# Altium footprint library MOLEX SMD.PcbLib: 54 footprints (part 4 of 4) (continued)
## MOLEX_502426-6030 [mm] "0.40mm Pitch SlimStack™ Dual Row 60 Circuits Surface Mount Vertical Receptacle Board-to-Board With Vacuum Tape" (continued)
Mechanical 15:
  lines w0.05: -7.8,-1.7 -7.8,1.7 7.8,1.7 7.8,-1.7 -7.8,-1.7
3D body "MOLEX_502426-6030.stp": height 0.98, standoff -0.02, extent -7.55,-1.3 7.55,1.3

## MOLEX_502430-6030 [mm] "0.40mm Pitch SlimStack™ Dual Row 60 Circuits Surface Mount Vertical Plug Board-to-Board With Vacuum Tape"
height 1
pads (62):
  rect 0.22x0.66 smd: 1(-5.8,0.855) 2(-5.8,-0.855) 3(-5.4,0.855) 4(-5.4,-0.855) 5(-5,0.855) 6(-5,-0.855) 7(-4.6,0.855) 8(-4.6,-0.855) 9(-4.2,0.855) 10(-4.2,-0.855) 11(-3.8,0.855) 12(-3.8,-0.855) 13(-3.4,0.855) 14(-3.4,-0.855) 15(-3,0.855) 16(-3,-0.855) 17(-2.6,0.855) 18(-2.6,-0.855) 19(-2.2,0.855) 20(-2.2,-0.855) 21(-1.8,0.855) 22(-1.8,-0.855) 23(-1.4,0.855) 24(-1.4,-0.855) 25(-1,0.855) 26(-1,-0.855) 27(-0.6,0.855) 28(-0.6,-0.855) 29(-0.2,0.855) 30(-0.2,-0.855) 31(0.2,0.855) 32(0.2,-0.855) 33(0.6,0.855) 34(0.6,-0.855) 35(1,0.855) 36(1,-0.855) 37(1.4,0.855) 38(1.4,-0.855) 39(1.8,0.855) 40(1.8,-0.855) 41(2.2,0.855) 42(2.2,-0.855) 43(2.6,0.855) 44(2.6,-0.855) 45(3,0.855) 46(3,-0.855) 47(3.4,0.855) 48(3.4,-0.855) 49(3.8,0.855) 50(3.8,-0.855) 51(4.2,0.855) 52(4.2,-0.855) 53(4.6,0.855) 54(4.6,-0.855) 55(5,0.855) 56(5,-0.855) 57(5.4,0.855) 58(5.4,-0.855) 59(5.8,0.855) 60(5.8,-0.855)
  rect 0.35x0.44 smd: 61(-6.75,0) 62(6.75,0)
Top Layer:
  region: -5.91,-0.533 -5.69,-0.533 -5.69,-0.255 -5.91,-0.255
  region: -5.51,-0.533 -5.29,-0.533 -5.29,-0.255 -5.51,-0.255
  region: -5.11,-0.533 -4.89,-0.533 -4.89,-0.255 -5.11,-0.255
  region: -4.71,-0.533 -4.49,-0.533 -4.49,-0.255 -4.71,-0.255
  region: -4.31,-0.533 -4.09,-0.533 -4.09,-0.255 -4.31,-0.255
  region: -3.91,-0.533 -3.69,-0.533 -3.69,-0.255 -3.91,-0.255
  region: -3.51,-0.533 -3.29,-0.533 -3.29,-0.255 -3.51,-0.255
  region: -3.11,-0.533 -2.89,-0.533 -2.89,-0.255 -3.11,-0.255
  region: -2.71,-0.533 -2.49,-0.533 -2.49,-0.255 -2.71,-0.255
  region: -2.31,-0.533 -2.09,-0.533 -2.09,-0.255 -2.31,-0.255
  region: -1.91,-0.533 -1.69,-0.533 -1.69,-0.255 -1.91,-0.255
  region: -1.51,-0.533 -1.29,-0.533 -1.29,-0.255 -1.51,-0.255
  region: -1.11,-0.533 -0.89,-0.533 -0.89,-0.255 -1.11,-0.255
  region: -0.71,-0.533 -0.49,-0.533 -0.49,-0.255 -0.71,-0.255
  region: -0.31,-0.533 -0.09,-0.533 -0.09,-0.255 -0.31,-0.255
  region: 0.09,-0.533 0.31,-0.533 0.31,-0.255 0.09,-0.255
  region: 0.49,-0.533 0.71,-0.533 0.71,-0.255 0.49,-0.255
  region: 0.89,-0.533 1.11,-0.533 1.11,-0.255 0.89,-0.255
  region: 1.29,-0.533 1.51,-0.533 1.51,-0.255 1.29,-0.255
  region: 1.69,-0.533 1.91,-0.533 1.91,-0.255 1.69,-0.255
  region: 2.09,-0.533 2.31,-0.533 2.31,-0.255 2.09,-0.255
  region: 2.49,-0.533 2.71,-0.533 2.71,-0.255 2.49,-0.255
  region: 2.89,-0.533 3.11,-0.533 3.11,-0.255 2.89,-0.255
  region: 3.29,-0.533 3.51,-0.533 3.51,-0.255 3.29,-0.255
  region: 3.69,-0.533 3.91,-0.533 3.91,-0.255 3.69,-0.255
  region: 4.09,-0.533 4.31,-0.533 4.31,-0.255 4.09,-0.255
  region: 4.49,-0.533 4.71,-0.533 4.71,-0.255 4.49,-0.255
  region: 4.89,-0.533 5.11,-0.533 5.11,-0.255 4.89,-0.255
  region: 5.29,-0.533 5.51,-0.533 5.51,-0.255 5.29,-0.255
  region: 5.69,-0.533 5.91,-0.533 5.91,-0.255 5.69,-0.255
  region: 5.69,0.533 5.91,0.533 5.91,0.255 5.69,0.255
  region: 5.29,0.533 5.51,0.533 5.51,0.255 5.29,0.255
  region: 4.89,0.533 5.11,0.533 5.11,0.255 4.89,0.255
  region: 4.49,0.533 4.71,0.533 4.71,0.255 4.49,0.255
  region: 4.09,0.533 4.31,0.533 4.31,0.255 4.09,0.255
  region: 3.69,0.533 3.91,0.533 3.91,0.255 3.69,0.255
  region: 3.29,0.533 3.51,0.533 3.51,0.255 3.29,0.255
  region: 2.89,0.533 3.11,0.533 3.11,0.255 2.89,0.255
  region: 2.49,0.533 2.71,0.533 2.71,0.255 2.49,0.255
  region: 2.09,0.533 2.31,0.533 2.31,0.255 2.09,0.255
  region: 1.69,0.533 1.91,0.533 1.91,0.255 1.69,0.255
  region: 1.29,0.533 1.51,0.533 1.51,0.255 1.29,0.255
  region: 0.89,0.533 1.11,0.533 1.11,0.255 0.89,0.255
  region: 0.49,0.533 0.71,0.533 0.71,0.255 0.49,0.255
  region: 0.09,0.533 0.31,0.533 0.31,0.255 0.09,0.255
  region: -0.31,0.533 -0.09,0.533 -0.09,0.255 -0.31,0.255
  region: -0.71,0.533 -0.49,0.533 -0.49,0.255 -0.71,0.255
  region: -1.11,0.533 -0.89,0.533 -0.89,0.255 -1.11,0.255
  region: -1.51,0.533 -1.29,0.533 -1.29,0.255 -1.51,0.255
  region: -1.91,0.533 -1.69,0.533 -1.69,0.255 -1.91,0.255
  region: -2.31,0.533 -2.09,0.533 -2.09,0.255 -2.31,0.255
  region: -2.71,0.533 -2.49,0.533 -2.49,0.255 -2.71,0.255
  region: -3.11,0.533 -2.89,0.533 -2.89,0.255 -3.11,0.255
  region: -3.51,0.533 -3.29,0.533 -3.29,0.255 -3.51,0.255
  region: -3.91,0.533 -3.69,0.533 -3.69,0.255 -3.91,0.255
  region: -4.31,0.533 -4.09,0.533 -4.09,0.255 -4.31,0.255
  region: -4.71,0.533 -4.49,0.533 -4.49,0.255 -4.71,0.255
  region: -5.11,0.533 -4.89,0.533 -4.89,0.255 -5.11,0.255
  region: -5.51,0.533 -5.29,0.533 -5.29,0.255 -5.51,0.255
  region: -5.91,0.533 -5.69,0.533 -5.69,0.255 -5.91,0.255
Top Overlay:
  circle w0.25: c-6.525,1.6 r0.125
  lines w0.2: -7.13,-0.57 -7.13,-0.77 -6.84,-0.77 ; -7.13,0.57 -7.13,0.77 ; -6.84,-0.735 -6.675,-0.735 -6.675,-0.57 ; -6.675,-0.72 -6.47,-0.72 -6.42,-0.77 -6.26,-0.77 ; -6.675,0.57 -6.675,0.735 ; -6.675,0.72 -6.47,0.72 -6.42,0.77 -6.26,0.77 ; 6.26,-0.77 6.42,-0.77 6.47,-0.72 6.675,-0.72 ; 6.26,0.77 6.42,0.77 6.47,0.72 6.675,0.72 ; 6.675,-0.57 6.675,-0.735 6.84,-0.735 ; 6.675,0.57 6.675,0.735 ; 6.84,-0.77 7.13,-0.77 7.13,-0.57 ; 7.13,0.57 7.13,0.77 ; -7.13,0.77 -6.84,0.77 -7.13,0.77 ; -6.675,0.735 -6.84,0.735 -6.675,0.735 ; 6.675,0.735 6.84,0.735 6.675,0.735 ; 7.13,0.77 6.84,0.77 7.13,0.77
Mechanical 8:
  lines w0.05: -0.5,0 0,0 ; 0,-0.5 0,0 ; 0,0.5 0,0 ; 0.5,0 0,0 ; -6.925,-0.22 -6.75,0 -6.925,0.22 ; -6.925,-0.22 -6.575,-0.22 -6.575,0.22 -6.925,0.22 ; -6.925,-0.22 -6.925,0.22 ; -5.95,-0.525 -5.8,-0.39 -5.65,-0.525 ; -5.95,-0.525 -5.91,-0.525 -5.91,-1.185 ; -5.95,-0.525 -5.95,-0.255 -5.65,-0.255 -5.65,-0.525 ; -5.95,0.525 -5.8,0.39 -5.65,0.525 ; -5.95,0.525 -5.91,0.525 -5.91,1.185 ; -5.95,0.525 -5.95,0.255 -5.65,0.255 -5.65,0.525 ; -5.91,-1.185 -5.8,-0.855 -5.69,-1.185 ; -5.91,-1.185 -5.69,-1.185 ; -5.91,1.185 -5.8,0.855 -5.69,1.185 ; -5.91,1.185 -5.69,1.185 ; -5.69,-1.185 -5.69,-0.525 -5.65,-0.525 ; -5.69,1.185 -5.69,0.525 -5.65,0.525 ; 5.65,-0.525 5.8,-0.39 5.95,-0.525 ; 5.65,-0.525 5.69,-0.525 5.69,-1.185 ; 5.65,-0.525 5.65,-0.255 5.95,-0.255 5.95,-0.525 ; 5.65,0.525 5.8,0.39 5.95,0.525 ; 5.65,0.525 5.69,0.525 5.69,1.185 ; 5.65,0.525 5.65,0.255 5.95,0.255 5.95,0.525 ; 5.69,-1.185 5.8,-0.855 5.91,-1.185 ; 5.69,-1.185 5.91,-1.185 ; 5.69,1.185 5.8,0.855 5.91,1.185 ; 5.69,1.185 5.91,1.185 ; 5.91,-1.185 5.91,-0.525 5.95,-0.525 ; 5.91,1.185 5.91,0.525 5.95,0.525 ; 6.925,-0.22 6.75,0 6.925,0.22 ; 6.925,-0.22 6.925,0.22 ; 6.925,-0.22 6.575,-0.22 6.575,0.22 6.925,0.22
Mechanical 14:
  circle w0.25: c-6.525,1.6 r0.125
  lines w0.1: -6.84,-0.735 -6.675,-0.735 -6.675,0.735 -6.84,0.735 ; -6.675,-0.72 -6.47,-0.72 -6.42,-0.77 -6.15,-0.77 -6.1,-0.72 -5.87,-0.72 ; -6.675,0.72 -6.47,0.72 -6.42,0.77 -6.15,0.77 -6.1,0.72 -5.87,0.72 ; -5.87,-0.31 -5.87,-1.04 -5.73,-1.04 -5.73,-0.31 ; -5.87,0.31 -5.87,1.04 -5.73,1.04 -5.73,0.31 ; 5.73,-0.31 5.73,-1.04 5.87,-1.04 5.87,-0.31 ; 5.73,0.31 5.73,1.04 5.87,1.04 5.87,0.31 ; 5.87,-0.72 6.1,-0.72 6.15,-0.77 6.42,-0.77 6.47,-0.72 6.675,-0.72 ; 5.87,0.72 6.1,0.72 6.15,0.77 6.42,0.77 6.47,0.72 6.675,0.72 ; 6.84,-0.735 6.675,-0.735 6.675,0.735 6.84,0.735 ; -7.13,-0.77 -6.84,-0.77 -6.84,0.77 -7.13,0.77 -7.13,-0.77 ; -6.3,-0.31 -6.3,0.31 6.3,0.31 6.3,-0.31 -6.3,-0.31 ; 6.84,-0.77 7.13,-0.77 7.13,0.77 6.84,0.77 6.84,-0.77
Mechanical 15:
  lines w0.05: -7.38,-1.435 7.38,-1.435 7.38,1.435 -7.38,1.435 -7.38,-1.435
3D body "MOLEX_502430-6030.stp": height 0.78, standoff -0.02, extent -7.13,-1.04 7.13,1.04

## MOLEX_502570-0893 [mm] "1.10mm Pitch, Surface Mount, Normal Mount MicroSD Memory Card Connector"
height 2.03
pads (14):
  rect 0.8x1.5 smd: 1(-3.85,0) 2(-2.75,0) 3(-1.65,0) 4(-0.55,0) 5(0.55,0) 6(1.65,0) 7(2.75,0) 8(3.85,0)
  rect 1.4x1.7 smd: 9(-7.6,2.9) 10(5.3,2.9)
  rect 1.5x1.15 smd: 11(-4.05,-11.575) 12(-1.75,-11.575) 13(4.85,-11.575)
  rect 1.15x1.5 smd: 14(5.425,-6.85)
Top Layer keep-out:
  lines w0.1: -0.8,-11.687 0.2,-11.687 0.2,-11.2 -0.8,-11.2 -0.8,-11.687 ; 2.85,-10.8 5.75,-10.8 5.75,-9.4 2.85,-9.4 2.85,-10.8 ; 5.05,-5.9 5.05,-4.9 5.55,-4.9 5.55,-5.9 5.05,-5.9
Top Overlay:
  circle w0.25: c-3.975,2.925 r0.125
  lines w0.2: -8.05,1.65 -8.05,-11.9 -5.2,-11.9 ; -7.2,1.65 -7.2,-1.2 ccw(c-7.1,-1.2) -7.1,-1.3 -7,-1.3 ccw(c-7,-1.2) -6.9,-1.2 -6.9,1.65 ; -6.9,2.97 -6.9,3.6 ; -6.5,1.7 -6.45,1.7 cw(c-6.45,1.65) -6.4,1.65 -6.4,-1.2 ccw(c-6.3,-1.2) -6.3,-1.3 -6.2,-1.3 ccw(c-6.2,-1.2) -6.1,-1.2 -6.1,1.85 ccw(c-6.25,1.85) -6.25,2 -6.5,2 ; -6.5,3.6 -4.69,3.6 -4.69,2.323 ; -6.24,3.25 -6.29,3.25 -6.29,3.6 -6.24,3.55 -6.24,2.658 ccw(c-6.14,2.658) -6.158,2.56 ccw(c-0.65,32.05) 4.2,2.445 ; -6.21,3.22 -5.36,3.22 ; -6.21,3.6 -6.21,3.07 -5.71,3.07 -5.61,2.97 -5.36,2.97 -5.36,3.6 ; -6.01,3.07 cw(c-6.01,2.87) -5.81,2.87 -5.81,2.497 ; -5.81,2.702 -5.661,2.577 cw(c-5.79,2.424) -5.593,2.46 ; -5.79,-10.4 -4.99,-10.4 ; -4.99,-10.5 -4.99,-9.169 -6.034,-9.169 -5.79,-10.291 -5.79,-10.5 cw(c-5.94,-10.5) -5.94,-10.65 -6.57,-10.65 cw(c-6.57,-10.5) -6.72,-10.5 -6.72,-6.25 cw(c-6.57,-6.25) -6.57,-6.1 -6.035,-6.1 ccw(c-6.035,-5.95) -5.885,-5.95 -5.885,-5.55 cw(c-5.735,-5.55) -5.735,-5.4 -5.09,-5.4 cw(c-5.09,-5.9) -4.59,-5.9 -4.59,-10.5 ; -4.69,2.35 -4.39,2.35 -4.39,2.284 ; -4.2,-1.15 -4.2,-2 ccw(c-3.2,-2) -3.2,-3 -1.25,-3 ccw(c-1.25,-2) -0.25,-2 -0.25,-1.15 ; 0.25,-1.15 0.25,-2 ccw(c1.25,-2) 1.25,-3 3.2,-3 ccw(c3.2,-2) 4.2,-2 4.2,-1.15 ; 0.6,-11.9 3.7,-11.9 ; 4.473,-8 ccw(c4.56,-8.05) 4.46,-8.05 4.46,-8.55 ccw(c4.56,-8.55) 4.56,-8.65 5.75,-8.65 ; 5.06,-8.648 5.06,-8 ; 5.18,-4.5 5.18,-2.85 cw(c5.28,-2.85) 5.28,-2.75 5.75,-2.75 ; 5.18,-3.53 5.6,-3.53 ; 5.18,-3.35 5.6,-3.35 ; 5.18,-3.2 5.6,-3.2 ; 5.18,-3.18 5.5,-3.18 ccw(c5.5,-2.93) 5.75,-2.93 ; 5.18,-3.03 5.5,-3.03 ccw(c5.5,-2.93) 5.6,-2.93 ; 5.18,-3.01 5.41,-3.01 5.6,-2.82 ; 5.18,-2.91 5.51,-2.91 ; 5.37,-4.5 5.37,-3.53 ; 5.37,-4.35 5.6,-4.35 ; 5.37,-3.75 5.6,-3.75 ; 5.41,-8.65 5.41,-8 ; 5.47,-4.5 5.47,-4.35 ; 5.47,-3.75 5.47,-3.53 ; 5.6,-8.641 5.6,-8 ; 5.6,-4.5 5.6,-2.75 ; 5.6,-3.4 5.75,-3.399 ; 5.75,-9 5.75,-8 ; 5.75,-4.5 5.75,1.65 ; -7.5,-5.55 ccw(c-7.35,-5.55) -7.35,-5.7 -6.55,-5.7 ccw(c-6.55,-5.55) -6.4,-5.55 -6.4,-3.4 ccw(c-6.5,-3.4) -6.5,-3.3 -6.6,-3.3 ccw(c-6.6,-3.4) -6.7,-3.4 -6.7,-5.25 cw(c-6.75,-5.25) -6.75,-5.3 -7.15,-5.3 cw(c-7.15,-5.25) -7.2,-5.25 -7.2,-3.4 ccw(c-7.3,-3.4) -7.3,-3.3 -7.4,-3.3 ccw(c-7.4,-3.4) -7.5,-3.4 -7.5,-5.55
Mechanical 8:
  lines w0.1: -8.1,2.9 -7.6,2.9 ; -7.6,2.4 -7.6,2.9 ; -7.6,3.4 -7.6,2.9 ; -7.1,2.9 -7.6,2.9 ; -4.55,-11.575 -4.05,-11.575 ; -4.35,0 -3.85,0 ; -4.05,-12.075 -4.05,-11.575 ; -4.05,-11.075 -4.05,-11.575 ; -3.85,-0.5 -3.85,0 ; -3.85,0.5 -3.85,0 ; -3.55,-11.575 -4.05,-11.575 ; -3.35,0 -3.85,0 ; -3.25,0 -2.75,0 ; -2.75,-0.5 -2.75,0 ; -2.75,0.5 -2.75,0 ; -2.25,-11.575 -1.75,-11.575 ; -2.25,0 -2.75,0 ; -2.15,0 -1.65,0 ; -1.75,-12.075 -1.75,-11.575 ; -1.75,-11.075 -1.75,-11.575 ; -1.65,-0.5 -1.65,0 ; -1.65,0.5 -1.65,0 ; -1.25,-11.575 -1.75,-11.575 ; -1.15,0 -1.65,0 ; -1.05,0 -0.55,0 ; -0.55,-0.5 -0.55,0 ; -0.55,0.5 -0.55,0 ; -0.354,-0.354 0,0 ; -0.354,0.354 0,0 ; -0.05,0 -0.55,0 ; 0.05,0 0.55,0 ; 0.354,-0.354 0,0 ; 0.354,0.354 0,0 ; 0.55,-0.5 0.55,0 ; 0.55,0.5 0.55,0 ; 1.05,0 0.55,0 ; 1.15,0 1.65,0 ; 1.65,-0.5 1.65,0 ; 1.65,0.5 1.65,0 ; 2.15,0 1.65,0 ; 2.25,0 2.75,0 ; 2.75,-0.5 2.75,0 ; 2.75,0.5 2.75,0 ; 3.25,0 2.75,0 ; 3.35,0 3.85,0 ; 3.85,-0.5 3.85,0 ; 3.85,0.5 3.85,0 ; 4.35,-11.575 4.85,-11.575 ; 4.35,0 3.85,0 ; 4.8,2.9 5.3,2.9 ; 4.85,-12.075 4.85,-11.575 ; 4.85,-11.075 4.85,-11.575 ; 4.925,-6.85 5.425,-6.85 ; 5.3,2.4 5.3,2.9 ; 5.3,3.4 5.3,2.9 ; 5.35,-11.575 4.85,-11.575 ; 5.425,-7.35 5.425,-6.85 ; 5.425,-6.35 5.425,-6.85 ; 5.8,2.9 5.3,2.9 ; 5.925,-6.85 5.425,-6.85 ; -0.8,-11.7 -0.8,-11.2 ; -0.8,-11.7 0.2,-11.7 ; -0.8,-11.7 -0.3,-11.45 ; -0.8,-11.2 0.2,-11.2 ; -0.8,-11.2 -0.3,-11.45 ; -0.3,-11.45 0.2,-11.2 ; -0.3,-11.45 0.2,-11.7 ; 0.2,-11.7 0.2,-11.2 ; 2.85,-10.8 5.75,-10.8 ; 2.85,-10.8 2.85,-9.4 ; 2.85,-10.8 4.3,-10.1 ; 2.85,-9.4 5.75,-9.4 ; 2.85,-9.4 4.3,-10.1 ; 4.3,-10.1 5.75,-9.4 ; 4.3,-10.1 5.75,-10.8 ; 5.05,-5.9 5.05,-4.9 ; 5.05,-5.9 5.55,-5.9 ; 5.05,-5.9 5.3,-5.4 ; 5.05,-4.9 5.55,-4.9 ; 5.05,-4.9 5.3,-5.4 ; 5.3,-5.4 5.55,-4.9 ; 5.3,-5.4 5.55,-5.9 ; 5.55,-5.9 5.55,-4.9 ; 5.75,-10.8 5.75,-9.4 ; -8.3,2.05 -6.9,2.05 -6.9,3.75 -8.3,3.75 -8.3,2.05 ; -4.8,-12.15 -3.3,-12.15 -3.3,-11 -4.8,-11 -4.8,-12.15 ; -4.25,-0.75 -3.45,-0.75 -3.45,0.75 -4.25,0.75 -4.25,-0.75 ; -3.15,-0.75 -2.35,-0.75 -2.35,0.75 -3.15,0.75 -3.15,-0.75 ; -2.5,-12.15 -2.5,-11 -1,-11 -1,-12.15 -2.5,-12.15 ; -2.05,-0.75 -1.25,-0.75 -1.25,0.75 -2.05,0.75 -2.05,-0.75 ; -0.95,-0.75 -0.15,-0.75 -0.15,0.75 -0.95,0.75 -0.95,-0.75 ; 0.15,-0.75 0.95,-0.75 0.95,0.75 0.15,0.75 0.15,-0.75 ; 1.25,-0.75 2.05,-0.75 2.05,0.75 1.25,0.75 1.25,-0.75 ; 2.35,-0.75 3.15,-0.75 3.15,0.75 2.35,0.75 2.35,-0.75 ; 3.45,-0.75 4.25,-0.75 4.25,0.75 3.45,0.75 3.45,-0.75 ; 4.1,-12.15 4.1,-11 5.6,-11 5.6,-12.15 4.1,-12.15 ; 4.6,2.05 6,2.05 6,3.75 4.6,3.75 4.6,2.05 ; 4.85,-7.6 6,-7.6 6,-6.1 4.85,-6.1 4.85,-7.6
Mechanical 14:
  drawing of 210 lines, arcs and shapes, not listed
Mechanical 15:
  lines w0.05: -8.55,-12.4 6.25,-12.4 6.25,4 -8.55,4 -8.55,-12.4
3D body "MOLEX_502570-0893.stp": height 1.8, standoff 0, extent -8.05,-11.9 5.75,3.6

## MOLEX_504618-2010 [mm] "0.35mm Pitch SlimStack™ Dual Row 20 Circuits Surface Mount Vertical Receptacle (0.60mm Mated Heights)"
height 0.6
pads (24):
  rect 0.18x0.4 smd: 1(-1.575,-0.95) 2(-1.575,0.95) 3(-1.225,-0.95) 4(-1.225,0.95) 5(-0.875,-0.95) 6(-0.875,0.95) 7(-0.525,-0.95) 8(-0.525,0.95) 9(-0.175,-0.95) 10(-0.175,0.95) 11(0.175,-0.95) 12(0.175,0.95) 13(0.525,-0.95) 14(0.525,0.95) 15(0.875,-0.95) 16(0.875,0.95) 17(1.225,-0.95) 18(1.225,0.95) 19(1.575,-0.95) 20(1.575,0.95)
  rect 0.46x0.33 smd: 21(-2.23,-0.945) 22(-2.23,0.945) 23(2.23,-0.945) 24(2.23,0.945)
Top Layer keep-out:
  rectangle: -1.75,-0.58 1.75,-0.15
  rectangle: -1.75,0.15 1.75,0.58
Top Overlay:
  circle w0.25: c-1.575,-1.675 r0.125
  lines w0.2: -2.795,-0.43 -2.795,0.43 ; -2.705,-0.43 -2.705,0.43 ; -2.385,-0.43 -2.385,0.43 ; 2.385,-0.43 2.385,0.43 ; 2.705,-0.43 2.705,0.43 ; 2.795,-0.43 2.795,0.43 ; -2.055,-0.37 -2.055,0.37 2.055,0.37 2.055,-0.37 -2.055,-0.37
Mechanical 8:
  drawing of 162 lines, arcs and shapes, not listed
Mechanical 14:
  circle w0.25: c-1.575,-1.675 r0.125
  lines w0.1: -2.095,-0.88 -2.095,-0.61 -2.385,-0.61 -2.385,0.61 -2.095,0.61 -2.095,0.88 ; -2.095,-0.735 -2.035,-0.735 ; -2.095,0.735 -2.035,0.735 ; -1.855,-0.88 -1.815,-0.88 ; -1.855,-0.735 -1.815,-0.735 ; -1.855,0.735 -1.815,0.735 ; -1.855,0.88 -1.815,0.88 ; 1.815,-0.88 1.855,-0.88 ; 1.815,-0.735 1.855,-0.735 ; 1.815,0.735 1.855,0.735 ; 1.815,0.88 1.855,0.88 ; 2.035,-0.735 2.095,-0.735 ; 2.035,0.735 2.095,0.735 ; 2.095,-0.88 2.095,-0.61 2.385,-0.61 2.385,0.61 2.095,0.61 2.095,0.88 ; -2.795,-0.97 -1.855,-0.97 -1.855,-0.64 -2.035,-0.64 -2.035,-0.88 -2.705,-0.88 -2.705,0.88 -2.035,0.88 -2.035,0.64 -1.855,0.64 -1.855,0.97 -2.795,0.97 -2.795,-0.97 ; -2.055,-0.37 -2.055,0.37 2.055,0.37 2.055,-0.37 -2.055,-0.37 ; -1.815,-1 -1.815,-0.64 1.815,-0.64 1.815,-1 -1.815,-1 ; -1.815,0.64 -1.815,1 1.815,1 1.815,0.64 -1.815,0.64 ; 1.855,-0.97 2.795,-0.97 2.795,0.97 1.855,0.97 1.855,0.64 2.035,0.64 2.035,0.88 2.705,0.88 2.705,-0.88 2.035,-0.88 2.035,-0.64 1.855,-0.64 1.855,-0.97
Mechanical 15:
  lines w0.05: -3.145,-1.4 -3.145,1.4 3.145,1.4 3.145,-1.4 -3.145,-1.4
3D body "MOLEX_504618-2010.stp": height 0.6, standoff 0, extent -2.825,-1 2.825,1

## MOLEX_504618-5010 [mm] "0.35mm Pitch SlimStack™ Dual Row 50 Circuits Surface Mount Vertical Receptacle (0.60mm Mated Heights)"
height 0.6
pads (54):
  rect 0.18x0.4 smd: 1(-4.2,-0.95) 2(-4.2,0.95) 3(-3.85,-0.95) 4(-3.85,0.95) 5(-3.5,-0.95) 6(-3.5,0.95) 7(-3.15,-0.95) 8(-3.15,0.95) 9(-2.8,-0.95) 10(-2.8,0.95) 11(-2.45,-0.95) 12(-2.45,0.95) 13(-2.1,-0.95) 14(-2.1,0.95) 15(-1.75,-0.95) 16(-1.75,0.95) 17(-1.4,-0.95) 18(-1.4,0.95) 19(-1.05,-0.95) 20(-1.05,0.95) 21(-0.7,-0.95) 22(-0.7,0.95) 23(-0.35,-0.95) 24(-0.35,0.95) 25(0,-0.95) 26(0,0.95) 27(0.35,-0.95) 28(0.35,0.95) 29(0.7,-0.95) 30(0.7,0.95) 31(1.05,-0.95) 32(1.05,0.95) 33(1.4,-0.95) 34(1.4,0.95) 35(1.75,-0.95) 36(1.75,0.95) 37(2.1,-0.95) 38(2.1,0.95) 39(2.45,-0.95) 40(2.45,0.95) 41(2.8,-0.95) 42(2.8,0.95) 43(3.15,-0.95) 44(3.15,0.95) 45(3.5,-0.95) 46(3.5,0.95) 47(3.85,-0.95) 48(3.85,0.95) 49(4.2,-0.95) 50(4.2,0.95)
  rect 0.46x0.33 smd: 51(-4.855,-0.945) 52(-4.855,0.945) 53(4.855,-0.945) 54(4.855,0.945)
Top Layer keep-out:
  rectangle: -4.375,0.15 4.375,0.58
  rectangle: -4.375,-0.58 4.375,-0.15
Top Overlay:
  circle w0.25: c-4.2,-1.675 r0.125
  lines w0.2: -5.42,-0.43 -5.42,0.43 ; -5.33,-0.43 -5.33,0.43 ; -5.01,-0.43 -5.01,0.43 ; 5.01,-0.43 5.01,0.43 ; 5.33,-0.43 5.33,0.43 ; 5.42,-0.43 5.42,0.43 ; -4.68,-0.37 -4.68,0.37 4.68,0.37 4.68,-0.37 -4.68,-0.37
Mechanical 8:
  drawing of 342 lines, arcs and shapes, not listed
Mechanical 14:
  circle w0.25: c-4.2,-1.675 r0.125
  lines w0.1: -4.72,-0.88 -4.72,-0.61 -5.01,-0.61 -5.01,0.61 -4.72,0.61 -4.72,0.88 ; -4.72,-0.735 -4.66,-0.735 ; -4.72,0.735 -4.66,0.735 ; -4.48,-0.88 -4.44,-0.88 ; -4.48,-0.735 -4.44,-0.735 ; -4.48,0.735 -4.44,0.735 ; -4.48,0.88 -4.44,0.88 ; 4.44,-0.88 4.48,-0.88 ; 4.44,-0.735 4.48,-0.735 ; 4.44,0.735 4.48,0.735 ; 4.44,0.88 4.48,0.88 ; 4.66,-0.735 4.72,-0.735 ; 4.66,0.735 4.72,0.735 ; 4.72,-0.88 4.72,-0.61 5.01,-0.61 5.01,0.61 4.72,0.61 4.72,0.88 ; -5.42,-0.97 -4.48,-0.97 -4.48,-0.64 -4.66,-0.64 -4.66,-0.88 -5.33,-0.88 -5.33,0.88 -4.66,0.88 -4.66,0.64 -4.48,0.64 -4.48,0.97 -5.42,0.97 -5.42,-0.97 ; -4.68,-0.37 -4.68,0.37 4.68,0.37 4.68,-0.37 -4.68,-0.37 ; -4.44,-1 -4.44,-0.64 4.44,-0.64 4.44,-1 -4.44,-1 ; -4.44,0.64 -4.44,1 4.44,1 4.44,0.64 -4.44,0.64 ; 4.48,-0.97 5.42,-0.97 5.42,0.97 4.48,0.97 4.48,0.64 4.66,0.64 4.66,0.88 5.33,0.88 5.33,-0.88 4.66,-0.88 4.66,-0.64 4.48,-0.64 4.48,-0.97
Mechanical 15:
  lines w0.05: -5.67,-1.4 -5.67,1.4 5.67,1.4 5.67,-1.4 -5.67,-1.4
3D body "MOLEX_504618-5010.stp": height 0.6, standoff 0, extent -5.45,-1 5.45,1

## MOLEX_504622-2010 [mm] "0.35mm Pitch SlimStack™ Dual Row 20 Circuits Surface Mount Vertical Plug (0.60mm Mated Heights)"
height 0.48
pads (24):
  rect 0.18x0.485 smd: 1(1.575,-0.907) 2(1.575,0.907) 3(1.225,-0.907) 4(1.225,0.907) 5(0.875,-0.907) 6(0.875,0.907) 7(0.525,-0.907) 8(0.525,0.907) 9(0.175,-0.907) 10(0.175,0.907) 11(-0.175,-0.907) 12(-0.175,0.907) 13(-0.525,-0.907) 14(-0.525,0.907) 15(-0.875,-0.907) 16(-0.875,0.907) 17(-1.225,-0.907) 18(-1.225,0.907) 19(-1.575,-0.907) 20(-1.575,0.907)
  rect 0.28x0.485 smd: 21(1.975,-0.907) 22(1.975,0.907) 23(-1.975,-0.907) 24(-1.975,0.907)
Top Layer keep-out:
  rectangle: -2.15,0.335 2.15,0.565
  region: 2.15,-0.335 -2.15,-0.335 -2.15,-0.565 2.15,-0.565
Top Overlay:
  circle w0.25: c1.575,-1.675 r0.125
Mechanical 8:
  drawing of 292 lines, arcs and shapes, not listed
Mechanical 14:
  circle w0.25: c1.575,-1.675 r0.125
  lines w0.1: -2.395,-0.172 -2.055,-0.172 ; -2.395,0.172 -2.055,0.172 ; -1.975,-0.8 -1.875,-0.8 ; -1.975,-0.63 -1.975,-1 -1.875,-1 -1.875,-0.63 ; -1.975,0.63 -1.975,1 -1.875,1 -1.875,0.63 ; -1.975,0.8 -1.875,0.8 ; -1.625,-0.8 -1.525,-0.8 ; -1.625,-0.63 -1.625,-1 -1.525,-1 -1.525,-0.63 ; -1.625,0.63 -1.625,1 -1.525,1 -1.525,0.63 ; -1.625,0.8 -1.525,0.8 ; -1.275,-0.8 -1.175,-0.8 ; -1.275,-0.63 -1.275,-1 -1.175,-1 -1.175,-0.63 ; -1.275,0.63 -1.275,1 -1.175,1 -1.175,0.63 ; -1.275,0.8 -1.175,0.8 ; -0.925,-0.8 -0.825,-0.8 ; -0.925,-0.63 -0.925,-1 -0.825,-1 -0.825,-0.63 ; -0.925,0.63 -0.925,1 -0.825,1 -0.825,0.63 ; -0.925,0.8 -0.825,0.8 ; -0.575,-0.8 -0.475,-0.8 ; -0.575,-0.63 -0.575,-1 -0.475,-1 -0.475,-0.63 ; -0.575,0.63 -0.575,1 -0.475,1 -0.475,0.63 ; -0.575,0.8 -0.475,0.8 ; -0.225,-0.8 -0.125,-0.8 ; -0.225,-0.63 -0.225,-1 -0.125,-1 -0.125,-0.63 ; -0.225,0.63 -0.225,1 -0.125,1 -0.125,0.63 ; -0.225,0.8 -0.125,0.8 ; 0.125,-0.8 0.225,-0.8 ; 0.125,-0.63 0.125,-1 0.225,-1 0.225,-0.63 ; 0.125,0.63 0.125,1 0.225,1 0.225,0.63 ; 0.125,0.8 0.225,0.8 ; 0.475,-0.8 0.575,-0.8 ; 0.475,-0.63 0.475,-1 0.575,-1 0.575,-0.63 ; 0.475,0.63 0.475,1 0.575,1 0.575,0.63 ; 0.475,0.8 0.575,0.8 ; 0.825,-0.8 0.925,-0.8 ; 0.825,-0.63 0.825,-1 0.925,-1 0.925,-0.63 ; 0.825,0.63 0.825,1 0.925,1 0.925,0.63 ; 0.825,0.8 0.925,0.8 ; 1.175,-0.8 1.275,-0.8 ; 1.175,-0.63 1.175,-1 1.275,-1 1.275,-0.63 ; 1.175,0.63 1.175,1 1.275,1 1.275,0.63 ; 1.175,0.8 1.275,0.8 ; 1.525,-0.8 1.625,-0.8 ; 1.525,-0.63 1.525,-1 1.625,-1 1.625,-0.63 ; 1.525,0.63 1.525,1 1.625,1 1.625,0.63 ; 1.525,0.8 1.625,0.8 ; 1.875,-0.8 1.975,-0.8 ; 1.875,-0.63 1.875,-1 1.975,-1 1.975,-0.63 ; 1.875,0.63 1.875,1 1.975,1 1.975,0.63 ; 1.875,0.8 1.975,0.8 ; 2.055,-0.172 2.395,-0.172 ; 2.055,0.172 2.395,0.172 ; -2.395,-0.58 ccw(c-2.345,-0.58) -2.345,-0.63 2.345,-0.63 ccw(c2.345,-0.58) 2.395,-0.58 2.395,0.58 ccw(c2.345,0.58) 2.345,0.63 -2.345,0.63 ccw(c-2.345,0.58) -2.395,0.58 -2.395,-0.58 ; -2.055,-0.35 -2.055,0.35 2.055,0.35 2.055,-0.35 -2.055,-0.35
Mechanical 15:
  lines w0.05: -2.645,-1.4 2.645,-1.4 2.645,1.4 -2.645,1.4 -2.645,-1.4
3D body "MOLEX_504622-2010.stp": height 0.48, standoff 0, extent -2.395,-1 2.395,1

## MOLEX_504622-5010 [mm] "0.35mm Pitch SlimStack™ Dual Row 50 Circuits Surface Mount Vertical Plug (0.60mm Mated Heights)"
height 0.48
pads (54):
  rect 0.18x0.485 smd: 1(4.2,-0.907) 2(4.2,0.907) 3(3.85,-0.907) 4(3.85,0.907) 5(3.5,-0.907) 6(3.5,0.907) 7(3.15,-0.907) 8(3.15,0.907) 9(2.8,-0.907) 10(2.8,0.907) 11(2.45,-0.907) 12(2.45,0.907) 13(2.1,-0.907) 14(2.1,0.907) 15(1.75,-0.907) 16(1.75,0.907) 17(1.4,-0.907) 18(1.4,0.907) 19(1.05,-0.907) 20(1.05,0.907) 21(0.7,-0.907) 22(0.7,0.907) 23(0.35,-0.907) 24(0.35,0.907) 25(0,-0.907) 26(0,0.907) 27(-0.35,-0.907) 28(-0.35,0.907) 29(-0.7,-0.907) 30(-0.7,0.907) 31(-1.05,-0.907) 32(-1.05,0.907) 33(-1.4,-0.907) 34(-1.4,0.907) 35(-1.75,-0.907) 36(-1.75,0.907) 37(-2.1,-0.907) 38(-2.1,0.907) 39(-2.45,-0.907) 40(-2.45,0.907) 41(-2.8,-0.907) 42(-2.8,0.907) 43(-3.15,-0.907) 44(-3.15,0.907) 45(-3.5,-0.907) 46(-3.5,0.907) 47(-3.85,-0.907) 48(-3.85,0.907) 49(-4.2,-0.907) 50(-4.2,0.907)
  rect 0.28x0.485 smd: 51(4.6,-0.907) 52(4.6,0.907) 53(-4.6,-0.907) 54(-4.6,0.907)
Top Layer keep-out:
  region: 4.775,-0.335 -4.775,-0.335 -4.775,-0.565 4.775,-0.565
  rectangle: -4.775,0.335 4.775,0.565
Top Overlay:
  circle w0.25: c4.2,-1.675 r0.125
Mechanical 8:
  drawing of 652 lines, arcs and shapes, not listed
Mechanical 14:
  drawing of 233 lines, arcs and shapes, not listed
Mechanical 15:
  lines w0.05: -5.27,-1.4 -5.27,1.4 5.27,1.4 5.27,-1.4 -5.27,-1.4
3D body "MOLEX_504622-5010.stp": height 0.48, standoff 0, extent -5.02,-1 5.02,1